# Altium footprint library AltiumLibraryOld.PcbLib: 82 footprints (part 4 of 6)
Each footprint in its own frame and in the unit in brackets; x right, y up, seen from the top. Pads: shape width x height; smd on the part's side, far side on the other; paste and mask are expansions set on the pad; w line width, h text height; cw(c..) or ccw(c..) is an arc to the next point about the centre after c.
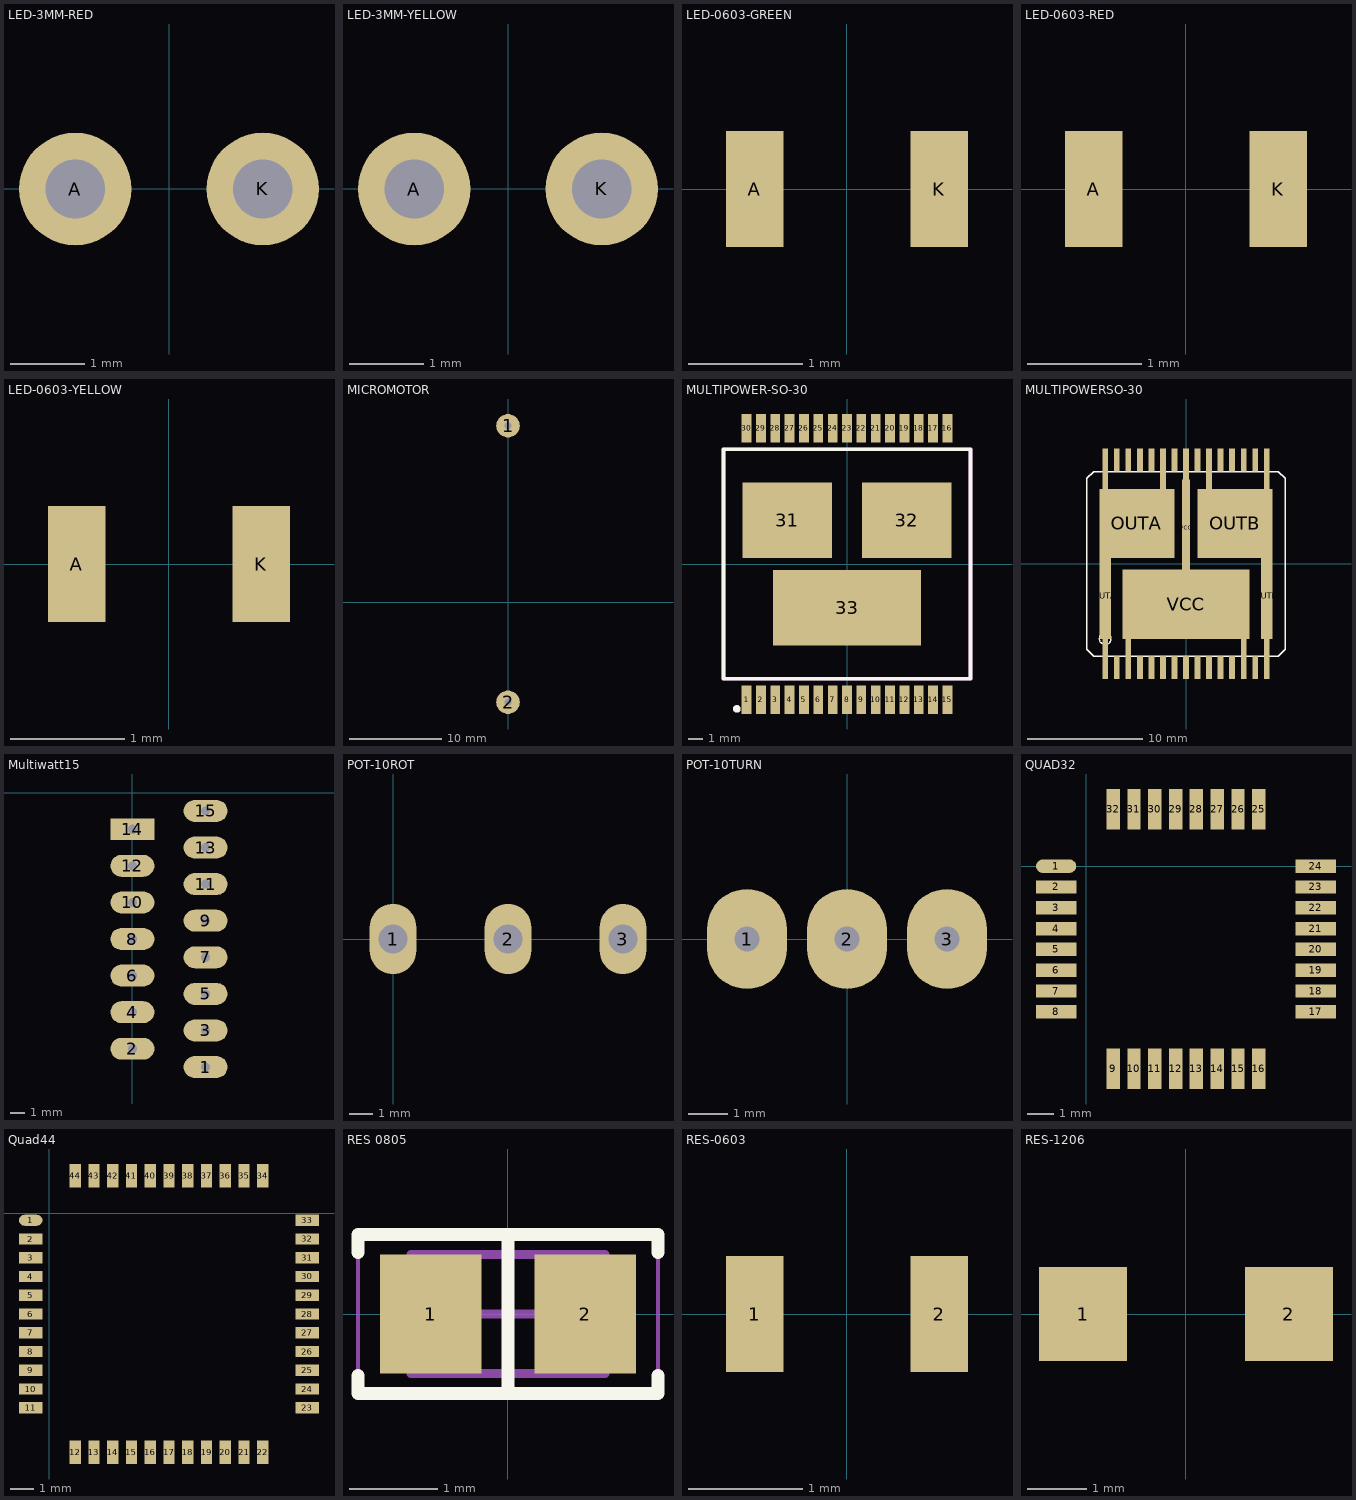
[diagram p3: the footprints below, top view; thin cyan lines are the x and y axes]

## LED-3MM-RED [mil]
pads (2):
  round 60 hole 31.5: A(-50,0) K(50,0)
3D body "SW3dPS-LEDd3R.STEP": height 217.04, standoff -97.93, extent -65.51,-65.13 64.41,64.8

## LED-3MM-YELLOW [mil]
pads (2):
  round 60 hole 31.5: A(-50,0) K(50,0)
3D body "SW3dPS-LEDd3Y.STEP": height 217.04, standoff -97.93, extent -65.51,-65.13 64.41,64.8

## LED-0603-GREEN [mil]
pads (2):
  rect 20x40 smd: A(-31.89,0) K(31.89,0)
3D body "User Library-led0603_GRE.step": height 43.31, standoff 0, extent -31.89,-15.74 31.89,15.75

## LED-0603-RED [mil]
pads (2):
  rect 20x40 smd: A(-31.89,0) K(31.89,0)
3D body "User Library-led0603_RED.step": height 43.31, standoff 0, extent -31.89,-15.74 31.89,15.75

## LED-0603-YELLOW [mil]
pads (2):
  rect 20x40 smd: A(-31.89,0) K(31.89,0)
3D body "User Library-led0603_YEL.step": height 43.31, standoff 0, extent -31.89,-15.74 31.89,15.75

## MICROMOTOR [mm]
pads (2):
  round 2.54 hole 0.8: 1(0,19.05) 2(0,-10.795)
3D body "User Library-Pololu Extended Micro Metal Bracket.step": height 11.5, standoff 0, extent 7.366,-9.525 24.666,17.075
3D body "User Library-MOTOR, POLOLU.step": height 9.95, standoff -0.05, extent -0.762,-2.094 34.008,9.906

## MULTIPOWER-SO-30 [mm]
pads (33):
  rect 0.68x2 smd: 1(-7,-9.45) 2(-6,-9.45) 3(-5,-9.45) 4(-4,-9.45) 5(-3,-9.45) 6(-2,-9.45) 7(-1,-9.45) 8(0,-9.45) 9(1,-9.45) 10(2,-9.45) 11(3,-9.45) 12(4,-9.45) 13(5,-9.45) 14(6,-9.45) 15(7,-9.45) 16(7,9.45) 17(6,9.45) 18(5,9.45) 19(4,9.45) 20(3,9.45) 21(2,9.45) 22(1,9.45) 23(0,9.45) 24(-1,9.45) 25(-2,9.45) 26(-3,9.45) 27(-4,9.45) 28(-5,9.45) 29(-6,9.45) 30(-7,9.45)
  rect 6.23x5.25 smd: 31(-4.165,3.05) 32(4.165,3.05)
  rect 10.3x5.25 smd: 33(0,-3.05)
Top Overlay:
  circle w0.254: c-7.672,-10.094 r0.14
  lines w0.254: -8.6,-8 -8.6,8 8.6,8 8.6,-8 -8.6,-8
Mechanical 15:
  lines w0.254: -8.6,-8 -8.6,8 8.6,8 8.6,-8 -8.6,-8

## MULTIPOWERSO-30 [mm]
pads (36):
  rect 0.508x12 smd: 1(-7,-4) 15(7,-4) 16(7,4) 30(-7,4)
  rect 0.508x2 smd: 2(-6,-9) 4(-4,-9) 5(-3,-9) 6(-2,-9) 7(-1,-9) 8(0,-9) 9(1,-9) 10(2,-9) 11(3,-9) 12(4,-9) 14(6,-9) 17(6,9) 18(5,9) 19(4,9) 20(3,9) 22(1,9) 24(-1,9) 26(-3,9) 27(-4,9) 28(-5,9) 29(-6,9)
  rect 0.508x4 smd: 3(-5,-8) 13(5,-8) 21(2,8) 23(0,8) 25(-2,8)
  rect 1x7.5 smd: OUTA(-7,-2.755) OUTB(7,-2.755)
  rect 6.5x6 smd: OUTA(-4.25,3.5) OUTB(4.25,3.5)
  rect 11x6 smd: VCC(0,-3.5)
  rect 0.65x8.3 smd: VCC(0,3.145)
Top Overlay:
  circle w0.127: c-7,-6.5 r0.5
  lines w0.127: -8.6,-7.4 -8.6,7.4 -8,8 8,8 8.6,7.4 8.6,-7.4 8,-8 -8,-8 -8.6,-7.4
Top Paste:
  circle w0: c4,-5.5 r0.3
  circle w0: c2,-5.5 r0.3
  circle w0: c0,-5.5 r0.3
  circle w0: c-2,-5.5 r0.3
  circle w0: c-4,-5.5 r0.3
  circle w0: c4,-3.5 r0.3
  circle w0: c2,-3.5 r0.3
  circle w0: c0,-3.5 r0.3
  circle w0: c-2,-3.5 r0.3
  circle w0: c-4,-3.5 r0.3
  circle w0: c4,-1.5 r0.3
  circle w0: c2,-1.5 r0.3
  circle w0: c0,-1.5 r0.3
  circle w0: c-2,-1.5 r0.3
  circle w0: c-4,-1.5 r0.3
  circle w0: c6,1.5 r0.3
  circle w0: c4,1.5 r0.3
  circle w0: c2,1.5 r0.3
  circle w0: c-2,1.5 r0.3
  circle w0: c-4,1.5 r0.3
  circle w0: c-6,1.5 r0.3
  circle w0: c6,3.5 r0.3
  circle w0: c4,3.5 r0.3
  circle w0: c2,3.5 r0.3
  circle w0: c-2,3.5 r0.3
  circle w0: c-4,3.5 r0.3
  circle w0: c-6,3.5 r0.3
  circle w0: c6,5.5 r0.3
  circle w0: c4,5.5 r0.3
  circle w0: c2,5.5 r0.3
  circle w0: c-2,5.5 r0.3
  circle w0: c-4,5.5 r0.3
  circle w0: c-6,5.5 r0.3
  region: 7.25,-10.002 6.755,-10.002 6.755,-7.995 7.25,-7.995
  region: 5.25,-10.021 4.762,-10.021 4.762,-7.995 5.25,-7.995
  region: -4.75,-10.017 -5.262,-10.017 -5.262,-7.995 -4.75,-7.995
  region: -6.75,-10.021 -7.269,-10.021 -7.269,-7.995 -6.75,-7.995
  region: 6.764,9.995 7.25,9.995 7.25,8.011 6.764,8.011
  region: 1.752,9.995 2.25,9.995 2.25,8.003 1.752,8.003
  region: -0.251,9.995 0.25,9.995 0.25,8.018 -0.251,8.018
  region: -2.255,9.995 -1.75,9.995 -1.75,8.014 -2.255,8.014
  region: -7.263,9.995 -6.75,9.995 -6.75,8.01 -7.263,8.01
Top Solder:
  circle w0: c4,-5.5 r0.4
  circle w0: c2,-5.5 r0.4
  circle w0: c0,-5.5 r0.4
  circle w0: c-2,-5.5 r0.4
  circle w0: c-4,-5.5 r0.4
  circle w0: c4,-3.5 r0.4
  circle w0: c2,-3.5 r0.4
  circle w0: c0,-3.5 r0.4
  circle w0: c-2,-3.5 r0.4
  circle w0: c-4,-3.5 r0.4
  circle w0: c4,-1.5 r0.4
  circle w0: c2,-1.5 r0.4
  circle w0: c0,-1.5 r0.4
  circle w0: c-2,-1.5 r0.4
  circle w0: c-4,-1.5 r0.4
  circle w0: c6,1.5 r0.4
  circle w0: c4,1.5 r0.4
  circle w0: c2,1.5 r0.4
  circle w0: c-2,1.5 r0.4
  circle w0: c-4,1.5 r0.4
  circle w0: c-6,1.5 r0.4
  circle w0: c6,3.5 r0.4
  circle w0: c4,3.5 r0.4
  circle w0: c2,3.5 r0.4
  circle w0: c-2,3.5 r0.4
  circle w0: c-4,3.5 r0.4
  circle w0: c-6,3.5 r0.4
  circle w0: c6,5.5 r0.4
  circle w0: c4,5.5 r0.4
  circle w0: c2,5.5 r0.4
  circle w0: c-2,5.5 r0.4
  circle w0: c-4,5.5 r0.4
  circle w0: c-6,5.5 r0.4
  region: 7.35,-10.109 6.659,-10.109 6.659,-7.895 7.35,-7.895
  region: 5.35,-10.122 4.663,-10.122 4.663,-7.895 5.35,-7.895
  region: -4.65,-10.109 -5.357,-10.109 -5.357,-7.895 -4.65,-7.895
  region: -6.65,-10.116 -7.365,-10.116 -7.365,-7.895 -6.65,-7.895
  region: 6.661,10.095 7.35,10.095 7.35,7.908 6.661,7.908
  region: 1.652,10.095 2.35,10.095 2.35,7.903 1.652,7.903
  region: -0.351,10.095 0.35,10.095 0.35,7.912 -0.351,7.912
  region: -2.354,10.095 -1.65,10.095 -1.65,7.91 -2.354,7.91
  region: -7.36,10.095 -6.65,10.095 -6.65,7.905 -7.36,7.905
3D body "multipowerSO-30.step": height 2.25, standoff -0.1, extent -8.65,-9.497 8.65,9.652

## Multiwatt15 [mil]
pads (15):
  oval 120x60 hole 25: 1(200,-750) 2(0,-700) 3(200,-650) 4(0,-600) 5(200,-550) 6(0,-500) 7(200,-450) 8(0,-400) 9(200,-350) 10(0,-300) 11(200,-250) 12(0,-200) 13(200,-150) 15(200,-50)
  rect 120x60 hole 25: 14(0,-100)
3D body "User Library-Multiwatt15V.STEP": height 831.1, standoff -46.85, extent -175,-785.83 214.37,-14.17

## POT-10ROT [mil]
pads (3):
  oval 80x120 hole 49.21: 1(0,0) 2(196.85,0) 3(393.7,0)
3D body "B10K potentiometer 10K.stp": height 828.74, standoff -137.8, extent -137.59,-780.71 535.6,203.54

## POT-10TURN [mil]
pads (3):
  oval 80x100 hole 25: 1(-100,0) 2(0,0) 3(100,0)
3D body "User Library-3296W.step": height 454.72, standoff -62.99, extent -187.59,-94.48 187.6,94.5

## QUAD32 [mil]
pads (32):
  oval 60x20 smd: 1(-45,0)
  rect 60x20 smd: 2(-45,-31) 3(-45,-62) 4(-45,-93) 5(-45,-124) 6(-45,-155) 7(-45,-186) 8(-45,-217) 17(342,-217) 18(342,-186) 19(342,-155) 20(342,-124) 21(342,-93) 22(342,-62) 23(342,-31) 24(342,0)
  rect 20x60 smd: 9(40,-302) 10(71,-302) 11(102,-302) 12(133,-302) 13(164,-302) 14(195,-302) 15(226,-302) 16(257,-302) 25(257,85) 26(226,85) 27(195,85) 28(164,85) 29(133,85) 30(102,85) 31(71,85) 32(40,85)
3D body "User Library-PTQFPK32.step": height 68, standoff 5, extent -32,-289 328,71

## Quad44 [mm]
pads (44):
  oval 1x0.47 smd: 1(-0.8,-0.3)
  rect 1x0.47 smd: 2(-0.8,-1.1) 3(-0.8,-1.9) 4(-0.8,-2.7) 5(-0.8,-3.5) 6(-0.8,-4.3) 7(-0.8,-5.1) 8(-0.8,-5.9) 9(-0.8,-6.7) 10(-0.8,-7.5) 11(-0.8,-8.3) 23(11,-8.3) 24(11,-7.5) 25(11,-6.7) 26(11,-5.9) 27(11,-5.1) 28(11,-4.3) 29(11,-3.5) 30(11,-2.7) 31(11,-1.9) 32(11,-1.1) 33(11,-0.3)
  rect 0.47x1 smd: 12(1.1,-10.2) 13(1.9,-10.2) 14(2.7,-10.2) 15(3.5,-10.2) 16(4.3,-10.2) 17(5.1,-10.2) 18(5.9,-10.2) 19(6.7,-10.2) 20(7.5,-10.2) 21(8.3,-10.2) 22(9.1,-10.2) 34(9.1,1.6) 35(8.3,1.6) 36(7.5,1.6) 37(6.7,1.6) 38(5.9,1.6) 39(5.1,1.6) 40(4.3,1.6) 41(3.5,1.6) 42(2.7,1.6) 43(1.9,1.6) 44(1.1,1.6)
3D body "User Library-44 pin tqfp ic package.step": height 1.2, standoff 0.09, extent -0.9,-10.3 11.1,1.7

## RES 0805 [mm] "Chip"
height 0.7
pads (2):
  rect 1.15x1.35 smd: 1(-0.875,0) 2(0.875,0)
Top Overlay:
  lines w0.15: -1.7,-0.7 -1.7,-0.9 1.7,-0.9 1.7,-0.7 ; -1.7,0.7 -1.7,0.9 1.7,0.9 1.7,0.7 ; 0,-0.9 0,0.9
Mechanical 13:
  lines w0.1: -1.1,-0.675 1.1,-0.675 1.1,0.675 -1.1,0.675 -1.1,-0.675
Mechanical 15:
  lines w0.05: -1.7,-0.95 1.7,-0.95 1.7,0.95 -1.7,0.95 -1.7,-0.95
  lines w0.1: -0.5,0 0.5,0 ; 0,-0.5 0,0.5
3D body "0805 resistor.STEP": height 0.6, standoff 0, extent -0.95,-0.625 1.05,0.625

## RES-0603 [mil]
pads (2):
  rect 20x40 smd: 1(-31.89,0) 2(31.89,0)
3D body "User Library-0603 SMD Resistor.step": height 11.89, standoff 0, extent -31.49,-15.74 31.5,15.75

## RES-1206 [mm]
pads (2):
  rect 1.5x1.6 smd: 1(-1.75,0) 2(1.75,0)
3D body "User Library-SMD RESISTOR-1.step": height 0.68, standoff 0.08, extent -1.6,-0.762 1.6,0.838